# Altium footprint library PCB.PcbLib: 72 footprints (part 5 of 5)
Each footprint in its own frame and in the unit in brackets; x right, y up, seen from the top. Pads: shape width x height; smd on the part's side, far side on the other; paste and mask are expansions set on the pad; w line width, h text height; cw(c..) or ccw(c..) is an arc to the next point about the centre after c.
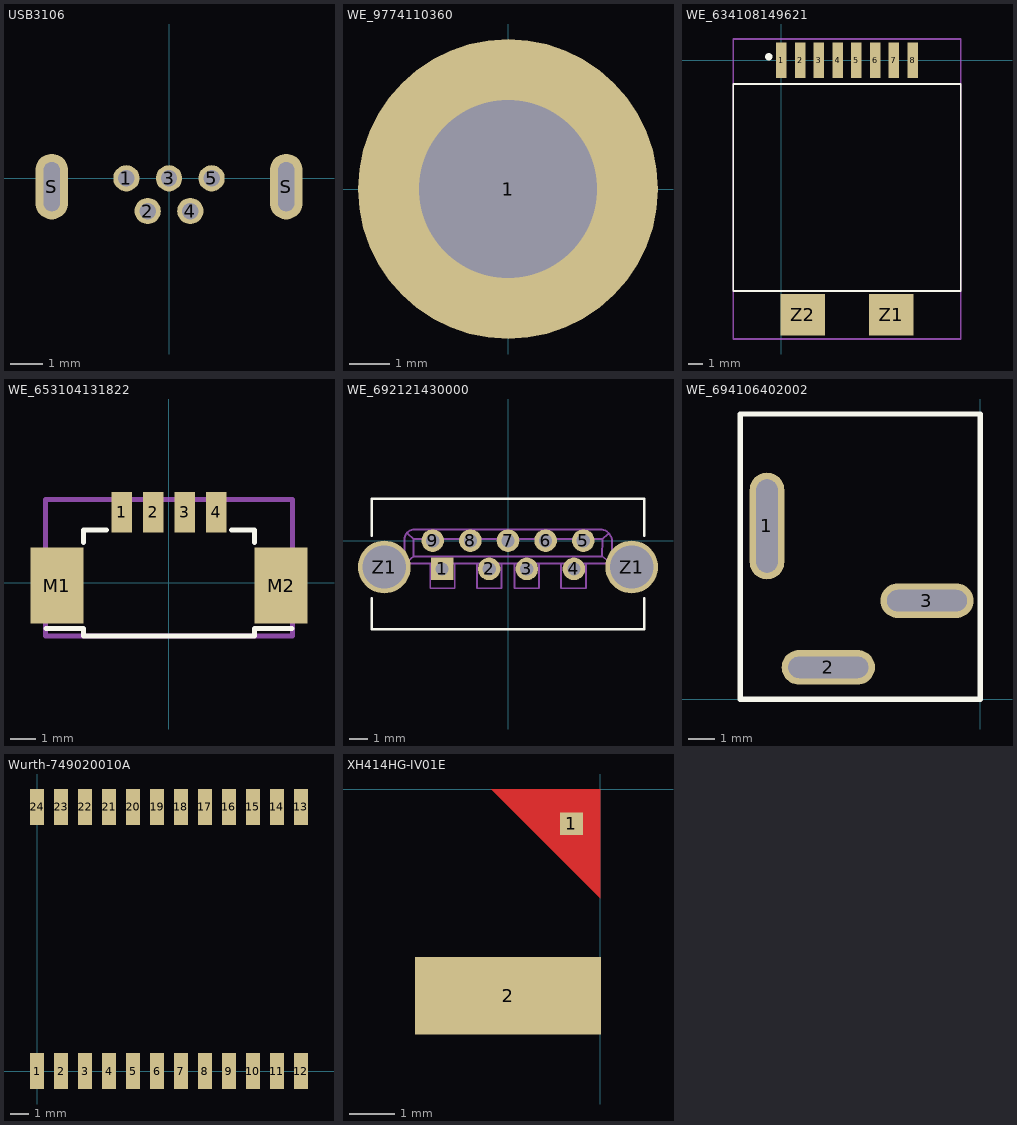
[diagram p4: the footprints below, top view; thin cyan lines are the x and y axes]

## USB3106 [mm]
pads (7):
  round 0.8 hole 0.5: 1(-1.3,0) 2(-0.65,-1) 3(0,0) 4(0.65,-1) 5(1.3,0)
  oval 1x2 hole 0.5 slot 1.5 at 90 deg: S(-3.575,-0.254) S(3.575,-0.254)
3D body: height 5.62, standoff -2.29, extent -3.982,-1.651 3.981,1.284

## WE_9774110360 [mm] "Standoffs & Spacers WA-SMSI SMD Steel Spacer M3 6mm"
height 11.6
pads (1):
  round 7.4 / inner round 0 / far side round 0 hole 4.4 unplated paste-403.566: 1(0,0)
Top Paste:
  region: -2.543,0.3 -2.523,0.502 -2.377,0.984 -2.139,1.429 -1.819,1.819 -1.429,2.139 -0.984,2.377 -0.502,2.523 -0.3,2.543 -0.3,2.542 -0.3,1.521 -0.301,1.528 -0.304,1.528 -0.596,1.439 -0.865,1.295 -1.101,1.101 -1.295,0.865 -1.439,0.596 -1.528,0.304 -1.528,0.302 -1.521,0.3
  region: -0.3,-2.543 -0.502,-2.523 -0.984,-2.377 -1.429,-2.139 -1.819,-1.819 -2.139,-1.429 -2.377,-0.984 -2.523,-0.502 -2.543,-0.3 -2.542,-0.3 -1.521,-0.3 -1.528,-0.301 -1.528,-0.304 -1.439,-0.596 -1.295,-0.865 -1.101,-1.101 -0.865,-1.295 -0.596,-1.439 -0.304,-1.528 -0.302,-1.528 -0.3,-1.521
  region: 2.543,-0.3 2.523,-0.502 2.377,-0.984 2.139,-1.429 1.819,-1.819 1.429,-2.139 0.984,-2.377 0.502,-2.523 0.3,-2.543 0.3,-2.542 0.3,-1.521 0.301,-1.528 0.304,-1.528 0.596,-1.439 0.865,-1.295 1.101,-1.101 1.295,-0.865 1.439,-0.596 1.528,-0.304 1.528,-0.302 1.521,-0.3
  region: 0.3,2.543 0.502,2.523 0.984,2.377 1.429,2.139 1.819,1.819 2.139,1.429 2.377,0.984 2.523,0.502 2.543,0.3 2.542,0.3 1.521,0.3 1.528,0.301 1.528,0.304 1.439,0.596 1.295,0.865 1.101,1.101 0.865,1.295 0.596,1.439 0.304,1.528 0.302,1.528 0.3,1.521
Mechanical 13:
  circle w0.1: c0,0 r2.175
3D body: height 11, standoff -1.4, extent -2.994,-3 2.994,2.976

## WE_634108149621 [mm] "WR-MJ_Modular Jack_Top Entry_8P8C T&R with Mylar for Pick & Place"
height 13
pads (10):
  rect 0.7x2.4 smd: 1(0,0) 2(1.27,0) 3(2.54,0) 4(3.81,0) 5(5.08,0) 6(6.35,0) 7(7.62,0) 8(8.89,0)
  rect 3x2.8 smd: Z1(7.445,-17.2) Z2(1.445,-17.2)
Top Overlay:
  circle w0.3: c-0.85,0.25 r0.1
  lines w0.127: -3.255,-15.6 -3.255,-1.6 12.145,-1.6 12.145,-15.6 -3.255,-15.6
Mechanical 15:
  lines w0.127: -3.255,-18.85 -3.255,1.45 12.145,1.45 12.145,-18.85 -3.255,-18.85
3D body: height 13.34, standoff 0, extent -3.255,-18.009 12.145,0.491

## WE_653104131822 [mm] "1.25mm SMT Male Horizontal Shrouded Header, 4p"
height 3.4
pads (6):
  rect 0.81x1.6 smd: 1(-1.875,2.8) 2(-0.625,2.8) 3(0.625,2.8) 4(1.875,2.8)
  rect 2.1x3 smd: M1(-4.425,-0.1) M2(4.425,-0.1)
Top Overlay:
  lines w0.2: -4.855,-1.8 -3.375,-1.8 -3.375,-2.1 3.375,-2.1 3.375,-1.8 4.855,-1.8 ; -3.375,1.6 -3.375,2.1 -2.475,2.1 ; 2.475,2.1 3.375,2.1 3.375,1.6
Mechanical 13:
  lines w0.2: -4.875,-2.1 -4.875,3.3 4.875,3.3 4.875,-2.1 -4.875,-2.1
3D body: height 3.43, standoff 0.02, extent -4.875,-2.1 4.875,3.3

## WE_692121430000 [mm] "Receptacle Through hole"
height 15
pads (11):
  rect 1.2x1.2 hole 0.7: 1(-3.5,-1.5)
  round 1.2 hole 0.7: 2(-1,-1.5) 3(1,-1.5) 4(3.5,-1.5) 5(4,0) 6(2,0) 7(0,0) 8(-2,0) 9(-4,0)
  round 2.8 hole 2.3: Z1(-6.57,-1.4) Z1(6.57,-1.4)
Top Overlay:
  lines w0.127: -7.239,-3.048 -7.239,-4.715 -7.175,-4.715 7.175,-4.715 7.239,-4.715 7.239,-3.048 ; -7.239,0.254 -7.239,2.235 -7.175,2.235 7.175,2.235 7.239,2.235 7.239,0.254
Mechanical 13:
  lines w0.102: -5.355,0.386 -5.012,0.086 ; -4.134,-1.242 -4.134,-2.527 -2.827,-2.527 -2.827,-1.242 ; -1.649,-1.242 -1.649,-2.527 -0.343,-2.527 -0.343,-1.264 ; 0.343,-1.285 0.343,-2.527 1.649,-2.527 1.649,-1.242 1.671,-1.242 ; 2.806,-1.264 2.806,-2.527 4.134,-2.527 4.134,-1.264 ; 5.333,0.364 5.012,0.086 ; -5.483,-1.221 -5.012,-0.835 ; -5.483,-1.221 -5.504,-1.221 -5.504,0.064 cw(c-4.969,0.064) -4.969,0.6 4.883,0.6 cw(c4.883,-0.043) 5.526,-0.043 5.526,-1.221 ; -5.483,-1.221 5.526,-1.221 ; -5.012,-0.835 -5.012,0.086 ; -5.012,-0.835 4.99,-0.835 ; -5.012,0.086 5.012,0.086 ; 4.99,-0.835 5.012,0.086 ; 4.99,-0.835 5.526,-1.221
3D body: height 15.01, standoff -3.76, extent -7.799,-4.715 7.799,2.235

## WE_694106402002 [mm] "WR-DC_DC Power Jack_Vertical_THT WR-DC_DC Power Jack_Vertical_THT"
height 14
pads (3):
  oval 1.3x4 hole 0.8 slot 3.5 at 90 deg: 1(-8,6.5)
  oval 3.5x1.3 hole 0.8 slot 3 at 0 deg: 2(-5.7,1.2) 3(-2,3.7)
Top Overlay:
  lines w0.2: -9,0 0,0 0,10.7 -9,10.7 -9,0
3D body: height 14, standoff -3.6, extent -9,0 0,10.7

## Wurth-749020010A [mm]
pads (24):
  rect 0.76x1.905 smd: 1(0,0) 2(1.27,0) 3(2.54,0) 4(3.81,0) 5(5.08,0) 6(6.35,0) 7(7.62,0) 8(8.89,0) 9(10.16,0) 10(11.43,0) 11(12.7,0) 12(13.97,0) 13(13.97,13.975) 14(12.7,13.975) 15(11.43,13.975) 16(10.16,13.975) 17(8.89,13.975) 18(7.62,13.975) 19(6.35,13.975) 20(5.08,13.975) 21(3.81,13.975) 22(2.54,13.975) 23(1.27,13.975) 24(0,13.975)
3D body: height 10, standoff 0.1, extent -0.635,1.143 14.478,12.954

## XH414HG-IV01E [mm]
pads (2):
  rect 0.5x0.5 smd: 1(-0.635,-0.762)
  rect 4.1x1.7 smd: 2(-2.032,-4.55)
Top Layer:
  region: -2.4,0 0,0 0,-2.4
3D body: height 1.85, standoff 0, extent -5.243,-5.245 -0.135,-0.135